# Altium footprint library DIP Component.PcbLib: 327 footprints (part 6 of 21)
Each footprint in its own frame and in the unit in brackets; x right, y up, seen from the top. Pads: shape width x height; smd on the part's side, far side on the other; paste and mask are expansions set on the pad; w line width, h text height; cw(c..) or ccw(c..) is an arc to the next point about the centre after c.
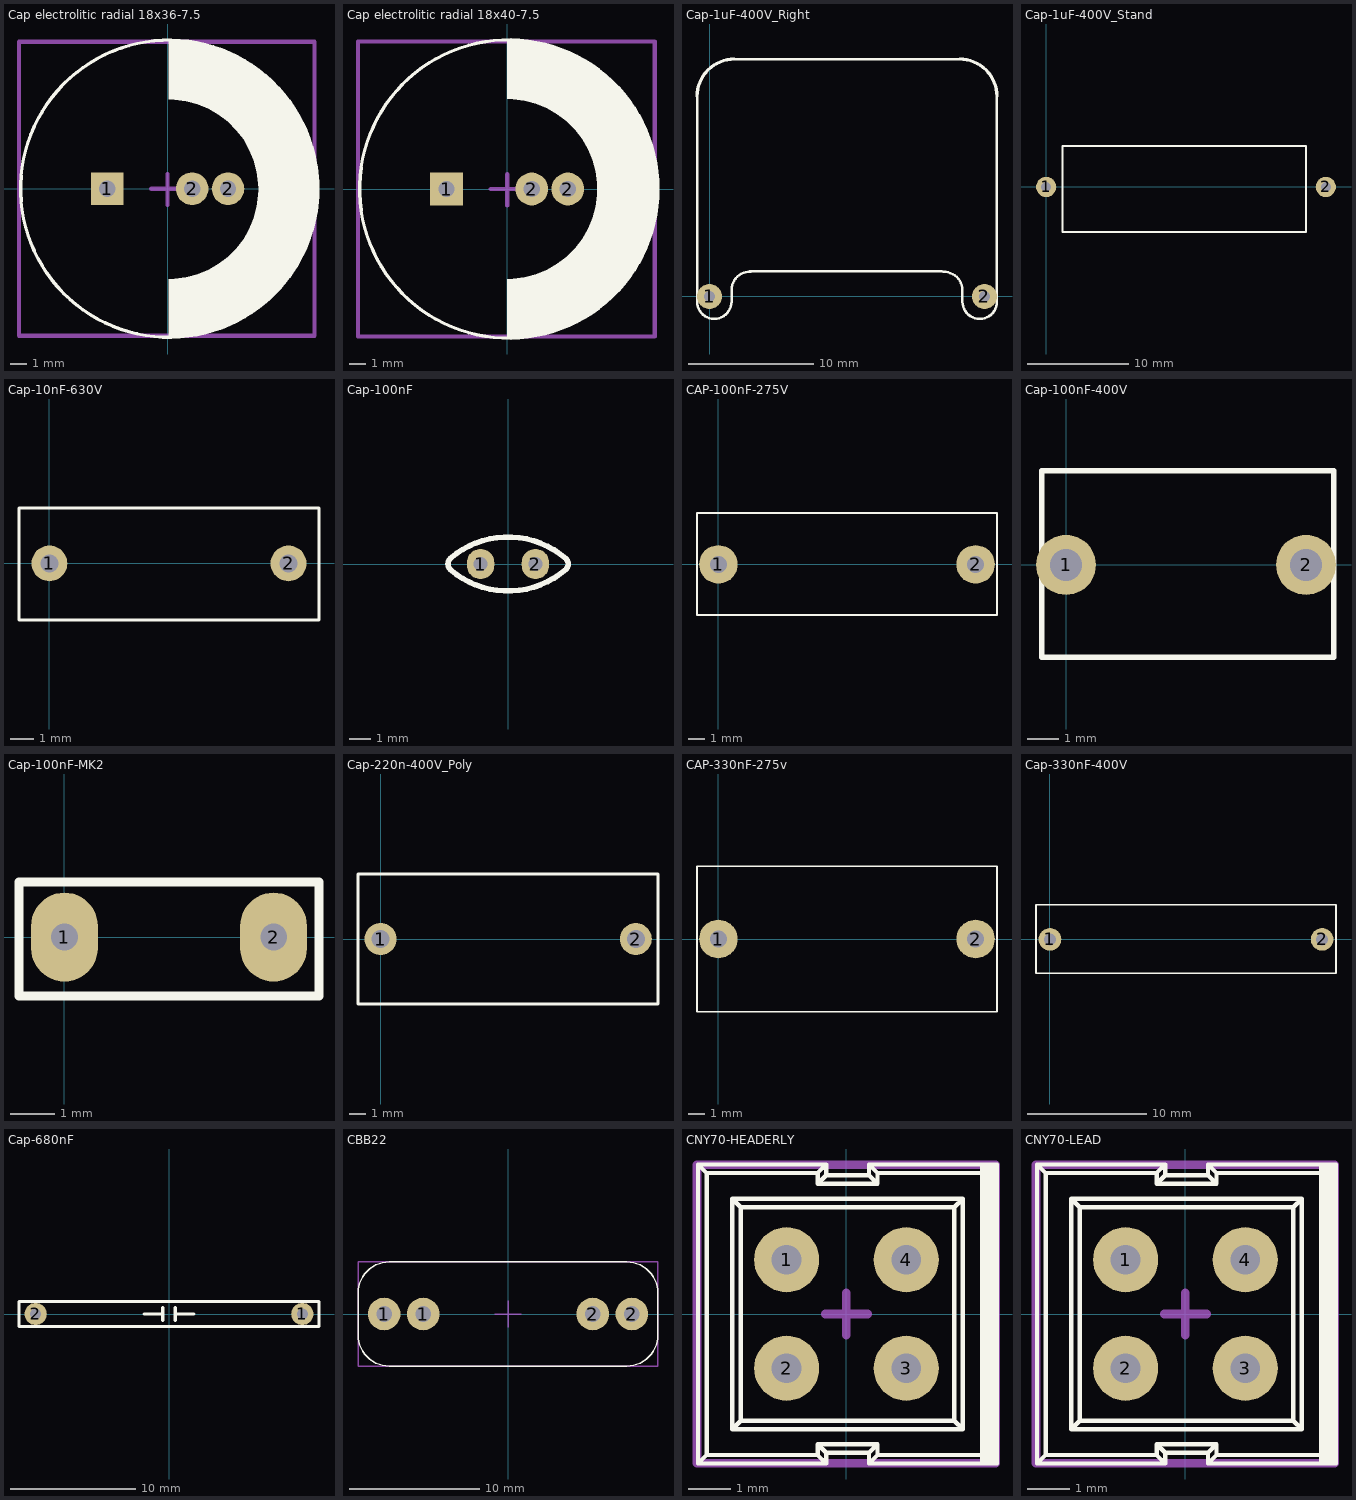
[diagram p5: the footprints below, top view; thin cyan lines are the x and y axes]

## Cap electrolitic radial 18x36-7.5 [mm] "Cap electrolitic radial 18x36-7.5-Design:Abbas Basereh"
height 36
pads (3):
  rect 2x2 hole 1: 1(-3.7,0)
  round 2 hole 1: 2(1.5,0) 2(3.7,0)
Top Overlay:
  circle w0.2: c0.096,0 r9.1
  region: 0.074,9.065 0.17,9.065 0.617,9.065 1.506,8.977 2.383,8.803 3.239,8.543 4.065,8.201 4.854,7.78 5.597,7.283 6.288,6.716 6.92,6.083 7.488,5.392 7.984,4.649 8.406,3.86 8.748,3.034 9.008,2.179 9.182,1.302 9.27,0.412 9.27,-0.035 9.27,-0.482 9.182,-1.372 9.008,-2.249 8.748,-3.105 8.406,-3.931 7.984,-4.719 7.488,-5.463 6.92,-6.154 6.288,-6.786 5.597,-7.353 4.854,-7.85 4.065,-8.271 3.239,-8.614 2.383,-8.873 1.506,-9.047 0.617,-9.135 0.17,-9.135 0.074,-9.135 0.074,-5.535 0.433,-5.523 1.147,-5.429 1.842,-5.243 2.506,-4.968 3.129,-4.608 3.7,-4.17 4.209,-3.662 4.647,-3.091 5.006,-2.468 5.282,-1.803 5.468,-1.108 5.562,-0.395 5.574,-0.035 5.562,0.325 5.468,1.038 5.282,1.733 5.006,2.397 4.647,3.021 4.209,3.591 3.7,4.1 3.129,4.538 2.506,4.898 1.842,5.173 1.147,5.359 0.433,5.453 0.074,5.465
Mechanical 15:
  lines w0.254: -1,0 1,0 ; 0,-1 0,0.9 ; -9.1,-9 -9.1,9 9,9 9,-9 -9.1,-9
3D body "User Library-Cap-EL(18x36-7_5)T.STEP": height 37, standoff -3, extent -9,-9 9.002,9

## Cap electrolitic radial 18x40-7.5 [mm] "Cap electrolitic radial 18x40-7.5-Design:Abbas Basereh"
height 40
pads (3):
  rect 2x2 hole 1: 1(-3.7,0)
  round 2 hole 1: 2(1.5,0) 2(3.7,0)
Top Overlay:
  circle w0.2: c0.096,0 r9.1
  region: 0.004,9.1 0.1,9.1 0.547,9.1 1.437,9.012 2.314,8.838 3.169,8.578 3.995,8.236 4.784,7.815 5.527,7.318 6.219,6.751 6.851,6.119 7.418,5.427 7.915,4.684 8.336,3.895 8.678,3.069 8.938,2.214 9.112,1.337 9.2,0.447 9.2,0 9.2,-0.447 9.112,-1.337 8.938,-2.214 8.678,-3.069 8.336,-3.895 7.915,-4.684 7.418,-5.427 6.851,-6.119 6.219,-6.751 5.527,-7.318 4.784,-7.815 3.995,-8.236 3.169,-8.578 2.314,-8.838 1.437,-9.012 0.547,-9.1 0.1,-9.1 0.004,-9.1 0.004,-5.5 0.364,-5.488 1.077,-5.394 1.772,-5.208 2.437,-4.933 3.06,-4.573 3.63,-4.135 4.139,-3.626 4.577,-3.056 4.937,-2.433 5.212,-1.768 5.398,-1.073 5.492,-0.36 5.504,0 5.492,0.36 5.398,1.073 5.212,1.768 4.937,2.433 4.577,3.056 4.139,3.626 3.63,4.135 3.06,4.573 2.437,4.933 1.772,5.208 1.077,5.394 0.364,5.488 0.004,5.5
Mechanical 15:
  lines w0.254: -1,0 1,0 ; 0,-1 0,0.9 ; -9.1,-9 -9.1,9 9,9 9,-9 -9.1,-9
3D body: height 41, standoff -3, extent -9,-8.999 9.002,9

## Cap-1uF-400V_Right [mm] "Bipolar Capacitor-Design:Ali Hafizi"
pads (2):
  round 2 hole 0.85: 1(0,0) 2(22,0)
Top Overlay:
  lines w0.2: -1,16 -1,-0.4 ccw(c0.38,-0.4) 1.76,-0.4 1.76,0.52 cw(c3.236,0.514) 3.305,1.988 ; 2,19 20,19 ; 3.2,2 18.59,2.003 ; 18.695,1.968 cw(c18.764,0.494) 20.24,0.5 20.24,-0.42 ccw(c21.62,-0.42) 23,-0.42 23,16
  lines w0.254: -1.001,16 cw(c2,16) 2,19.001 ; 20,19.001 cw(c20,16) 23.001,16

## Cap-1uF-400V_Stand [mm] "Bipolar Capacitor-Design:Ali Hafizi"
height 16.65
pads (2):
  round 2 hole 1: 1(0,0) 2(27.58,0)
Top Overlay:
  lines w0.2: 1.6,-4.43 1.6,4.03 25.6,4.03 25.6,-4.43 1.6,-4.43
3D body "User Library-Vishay_1uF-400V_MKT_373_STD_27_5pitch.STEP": height 23, standoff -3, extent -1.71,-6.51 29.29,6.49

## Cap-10nF-630V [mil] "Bipolar Capacitor-Design:Ali Hafizi"
pads (2):
  round 60 hole 30: 1(0,0) 2(400,0)
Top Overlay:
  lines w5: -50.97,-94.52 -50.97,92.52 451,92.52 451,-94.52 -50.97,-94.52
3D body "Cap 10n - 630V Poly_2009.STEP": height 480, standoff -68.11, extent -50.97,-94.52 451,92.52

## Cap-100nF [mil] "Bipolar Capacitor-Design:Ali Hafizi"
pads (2):
  oval 50x55 hole 25: 1(-50,0) 2(50,0)
Top Overlay:
  lines w10: -105.81,-9.79 ccw(c0,112.17) 106.05,-9.58 ; -105.81,9.79 cw(c0,-112.17) 106.05,9.58 ; -105.58,-9.52 cw(c-96.06,0) -105.58,9.52 ; 106,-9.52 ccw(c96.48,0) 106,9.52
3D body "Cap 100n.STEP": height 272.48, standoff -39.37, extent -114.93,-34 114.93,32.79

## CAP-100nF-275V [mil] "Bipolar Capacitor-Design:Ali Hafizi"
pads (2):
  round 90 hole 40: 1(0,0) 2(600,0)
Top Overlay:
  lines w3.94: -50,-118.11 -50,0 -50,120 650,120 650,0 650,-118.11 -50,-118.11

## Cap-100nF-400V [mil] "Bipolar Capacitor-Design:Ali Hafizi"
pads (2):
  round 75 hole 40: 1(0,0) 2(300,0)
Top Overlay:
  lines w7: -30.5,-115.39 334.5,-115.39 334.5,117.65 -30.5,117.65 -30.5,-115.39
3D body "Cap 100n - 400V Poly.STEP": height 460, standoff -88.11, extent -30.5,-115.39 334.5,117.65

## Cap-100nF-MK2 [mm] "Bipolar Capacitor-Design:Ali Hafizi"
height 5
pads (2):
  oval 1.5x2 hole 0.6: 1(0,0) 2(4.7,0)
Top Overlay:
  lines w0.2: -1.021,-1.328 -1.021,1.242 5.72,1.242 5.72,-1.328 -1.021,-1.328
3D body "cap.STEP": height 6.84, standoff -1.46, extent -0.75,-1.2 5.55,1.2

## Cap-220n-400V_Poly [mil] "Bipolar Capacitor-Design:Ali Hafizi"
pads (2):
  round 75 hole 42: 1(0,0) 2(600,0)
Top Overlay:
  lines w7: -53,-152.52 652,-152.52 652,152.52 -53,152.52 -53,-152.52
3D body "Cap 220n - 400V Poly.STEP": height 508.74, standoff -39.37, extent -53,-152.52 652,152.52

## CAP-330nF-275v [mil] "Bipolar Capacitor-Design:Ali Hafizi"
pads (2):
  round 90 hole 40: 1(0,0) 2(600,0)
Top Overlay:
  lines w3.94: -50,-170 -50,0 -50,170 650,170 650,120 650,0 650,-170 -50,-170

## Cap-330nF-400V [mil] "Bipolar Capacitor-Design:Ali Hafizi"
pads (2):
  round 75 hole 40: 1(0,0) 2(900,0)
Top Overlay:
  lines w5: -46.26,-112.21 945.87,-112.21 945.87,114.21 -46.26,114.21 -46.26,-112.21
3D body "Cap 330n - 400V Poly_2009.STEP": height 430, standoff -118.11, extent -18.04,-112.21 917,114.21

## Cap-680nF [mil] "Bipolar Capacitor-Design:Ali Hafizi"
height 393.7
pads (2):
  round 70 hole 35: 1(420,0) 2(-420,0)
Top Overlay:
  lines w10: -78.74,0 -19.68,0 ; -19.68,-19.68 -19.68,19.68 ; 19.68,-19.68 19.68,19.68 ; 19.68,0 78.74,0 ; -472.44,-39.37 472.44,-39.37 472.44,39.37 -472.44,39.37 -472.44,-39.37
3D body "680nF.STEP": height 497.8, standoff -33.7, extent -472.13,-13.39 472.76,683.32

## CBB22 [mm] "W23_0_H14_5_T8_0_P19"
height 13
pads (4):
  round 2.5 hole 1.2: 1(-9.5,0) 1(-6.5,0) 2(6.5,0) 2(9.5,0)
Top Overlay:
  lines w0.1: -11.5,-1.587 ccw(c-9.087,-1.587) -9.087,-4 9.087,-4 ccw(c9.087,-1.587) 11.5,-1.587 11.5,0 11.5,1.587 ccw(c9.087,1.587) 9.087,4 0,4 -9.087,4 ccw(c-9.087,1.587) -11.5,1.587 -11.5,0 -11.5,-1.587
Mechanical 15:
  lines w0.1: -1,0 1,0 ; 0,-1 0,1 ; -11.5,-4 -11.5,4 11.5,4 11.5,-4 -11.5,-4
3D body "User Library-CBB81_W23_0_H14_5_T8_0_P19_0.STEP": height 19.5, standoff -8, extent -11.499,-4 11.5,4

## CNY70-HEADERLY [mm] "Dimensions (L x W x H in mm): 7 x 7 x 6  • Peak operating distance: < 0.5 mm DESIGNER ABBAS BASEREH"
height 6
pads (4):
  round 1.524 hole 0.7: 1(-1.4,1.27) 2(-1.4,-1.27) 3(1.4,-1.27) 4(1.4,1.27)
Top Overlay:
  rectangle: 3.125,-3.5 3.525,3.5
  lines w0.1: -3.475,-3.5 -3.475,3.5 ; -3.475,-3.5 -3.275,-3.3 ; -3.475,-3.5 -0.475,-3.5 ; -3.475,3.5 -0.475,3.5 ; -3.475,3.5 -3.275,3.3 ; -3.275,-3.3 -3.275,3.3 ; -3.275,-3.3 -0.675,-3.3 ; -3.275,3.3 -0.675,3.3 ; -2.675,-2.7 2.725,-2.7 ; -2.675,-2.7 -2.675,2.7 ; -2.675,-2.7 -2.475,-2.5 ; -2.675,2.7 2.725,2.7 ; -2.675,2.7 -2.475,2.5 ; -2.475,-2.5 2.525,-2.5 ; -2.475,-2.5 -2.475,2.5 ; -2.475,2.5 2.525,2.5 ; -0.675,-3.3 -0.475,-3.5 ; -0.675,-3.3 -0.675,-3.05 ; -0.675,-3.05 -0.475,-3.25 ; -0.675,-3.05 0.725,-3.05 ; -0.675,3.05 -0.475,3.25 ; -0.675,3.05 -0.675,3.3 ; -0.675,3.05 0.725,3.05 ; -0.675,3.3 -0.475,3.5 ; -0.475,-3.5 -0.475,-3.25 ; -0.475,-3.25 0.525,-3.25 ; -0.475,3.25 -0.475,3.5 ; -0.475,3.25 0.525,3.25 ; 0.525,-3.5 0.525,-3.25 ; 0.525,-3.5 0.725,-3.3 ; 0.525,-3.5 3.525,-3.5 ; 0.525,-3.25 0.725,-3.05 ; 0.525,3.25 0.525,3.5 ; 0.525,3.25 0.725,3.05 ; 0.525,3.5 3.525,3.5 ; 0.525,3.5 0.725,3.3 ; 0.725,-3.3 0.725,-3.05 ; 0.725,-3.3 3.325,-3.3 ; 0.725,3.05 0.725,3.3 ; 0.725,3.3 3.325,3.3 ; 2.525,-2.5 2.525,2.5 ; 2.525,-2.5 2.725,-2.7 ; 2.525,2.5 2.725,2.7 ; 2.725,-2.7 2.725,2.7 ; 3.325,-3.3 3.325,3.3 ; 3.325,-3.3 3.525,-3.5 ; 3.325,3.3 3.525,3.5 ; 3.525,-3.5 3.525,3.5
Mechanical 15:
  lines w0.2: -0.5,0 0.5,0 ; 0,-0.5 0,0.5 ; -3.5,-3.5 3.5,-3.5 3.5,3.5 -3.5,3.5 -3.5,-3.5
3D body "User Library-cny70-2.STEP": height 11.5, standoff -2.5, extent -3.55,-3.5 3.45,3.5

## CNY70-LEAD [mm] "Dimensions (L x W x H in mm): 7 x 7 x 6  • Peak operating distance: < 0.5 mm DESIGNER ABBAS BASEREH"
height 6
pads (4):
  round 1.524 hole 0.7: 1(-1.4,1.27) 2(-1.4,-1.27) 3(1.4,-1.27) 4(1.4,1.27)
Top Overlay:
  rectangle: 3.125,-3.5 3.525,3.5
  lines w0.1: -3.475,-3.5 -0.475,-3.5 ; -3.475,-3.5 -3.275,-3.3 ; -3.475,-3.5 -3.475,3.5 ; -3.475,3.5 -3.275,3.3 ; -3.475,3.5 -0.475,3.5 ; -3.275,-3.3 -0.675,-3.3 ; -3.275,-3.3 -3.275,3.3 ; -3.275,3.3 -0.675,3.3 ; -2.675,-2.7 -2.475,-2.5 ; -2.675,-2.7 -2.675,2.7 ; -2.675,-2.7 2.725,-2.7 ; -2.675,2.7 -2.475,2.5 ; -2.675,2.7 2.725,2.7 ; -2.475,-2.5 -2.475,2.5 ; -2.475,-2.5 2.525,-2.5 ; -2.475,2.5 2.525,2.5 ; -0.675,-3.3 -0.675,-3.05 ; -0.675,-3.3 -0.475,-3.5 ; -0.675,-3.05 0.725,-3.05 ; -0.675,-3.05 -0.475,-3.25 ; -0.675,3.05 0.725,3.05 ; -0.675,3.05 -0.675,3.3 ; -0.675,3.05 -0.475,3.25 ; -0.675,3.3 -0.475,3.5 ; -0.475,-3.5 -0.475,-3.25 ; -0.475,-3.25 0.525,-3.25 ; -0.475,3.25 0.525,3.25 ; -0.475,3.25 -0.475,3.5 ; 0.525,-3.5 3.525,-3.5 ; 0.525,-3.5 0.725,-3.3 ; 0.525,-3.5 0.525,-3.25 ; 0.525,-3.25 0.725,-3.05 ; 0.525,3.25 0.725,3.05 ; 0.525,3.25 0.525,3.5 ; 0.525,3.5 0.725,3.3 ; 0.525,3.5 3.525,3.5 ; 0.725,-3.3 3.325,-3.3 ; 0.725,-3.3 0.725,-3.05 ; 0.725,3.05 0.725,3.3 ; 0.725,3.3 3.325,3.3 ; 2.525,-2.5 2.725,-2.7 ; 2.525,-2.5 2.525,2.5 ; 2.525,2.5 2.725,2.7 ; 2.725,-2.7 2.725,2.7 ; 3.325,-3.3 3.525,-3.5 ; 3.325,-3.3 3.325,3.3 ; 3.325,3.3 3.525,3.5 ; 3.525,-3.5 3.525,3.5
Mechanical 15:
  lines w0.2: -0.5,0 0.5,0 ; 0,-0.5 0,0.5 ; -3.5,-3.5 -3.5,3.5 3.5,3.5 3.5,-3.5 -3.5,-3.5
3D body "SW3dPS-cny70-1.STEP": height 6.5, standoff -5.25, extent -3.5,-3.5 3.5,3.5